# Altium footprint library RcTransmitterPcblib1.PcbLib: 17 footprints (part 1 of 2)
Each footprint in its own frame and in the unit in brackets; x right, y up, seen from the top. Pads: shape width x height; smd on the part's side, far side on the other; paste and mask are expansions set on the pad; w line width, h text height; cw(c..) or ccw(c..) is an arc to the next point about the centre after c.
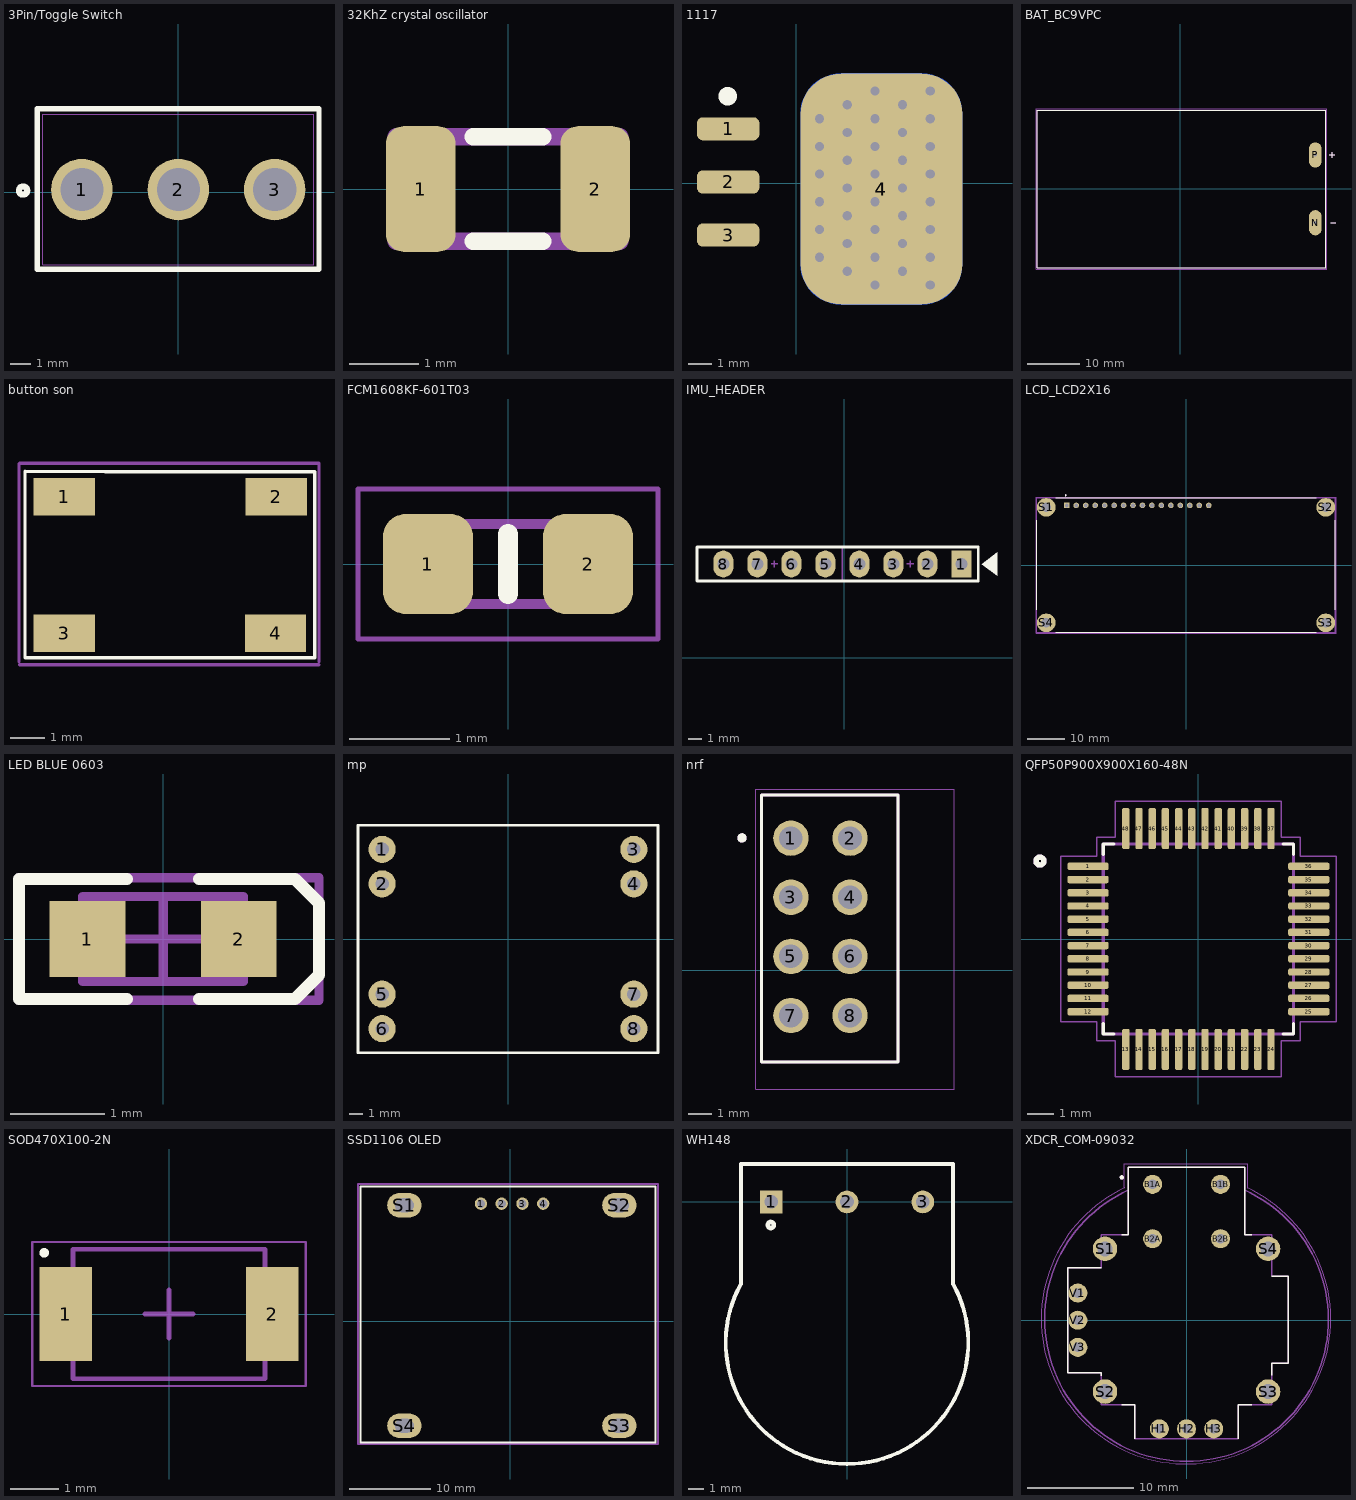
[diagram p0: the footprints below, top view; thin cyan lines are the x and y axes]

## 3Pin/Toggle Switch [mm] "4-1825136-5"
pads (3):
  round 3 hole 2.1: 1(-4.699,0.127) 2(0,0.127) 3(4.699,0.127)
Top Overlay:
  circle w0.3: c-7.569,0.076 r0.2
  lines w0.254: -6.883,-3.759 6.858,-3.759 6.858,4.064 -6.883,4.064 -6.883,-3.759
Mechanical 16:
  lines w0.05: -6.6,-3.552 6.6,-3.552 6.6,3.806 -6.6,3.806 -6.6,-3.552
3D body "c-4-1825136-5-a-3d.stp": height 29.3, standoff -5.24, extent -6.35,-3.302 6.35,3.556

## 32KhZ crystal oscillator [mm]
pads (2):
  rrect50% 1x1.8 smd: 1(-1.25,0) 2(1.25,0)
Top Overlay:
  lines w0.254: -0.5,-0.75 0.5,-0.75 ; -0.5,0.75 0.5,0.75
Mechanical 13:
  lines w0.254: -1.6,-0.75 1.6,-0.75 1.6,0.75 -1.6,0.75 -1.6,-0.75
3D body "User Library-NDK_NX3215SA.STEP": height 0.8, standoff 0, extent -1.6,-0.75 1.6,0.75

## 1117 [mm]
pads (5):
  rrect50% 2.7x1 smd paste-0.102 mask+0.051: 1(-2.95,2.351) 2(-2.95,0.051) 3(-2.95,-2.249)
  rrect50% 7x10 smd paste-0.102 mask+0.051: 4(3.683,-0.254)
  rrect50% 7x10 smd far side paste-0.102 mask+0.051: 4(3.683,-0.254)
via 5.798,-4.41 diameter 0.8 hole 0.4
via 3.398,-4.41 diameter 0.8 hole 0.4
via 5.798,-3.21 diameter 0.8 hole 0.4
via 4.598,-3.81 diameter 0.8 hole 0.4
via 3.398,-3.21 diameter 0.8 hole 0.4
via 2.198,-3.81 diameter 0.8 hole 0.4
via 0.998,-3.21 diameter 0.8 hole 0.4
via 5.798,-2.01 diameter 0.8 hole 0.4
via 4.598,-2.61 diameter 0.8 hole 0.4
via 3.398,-2.01 diameter 0.8 hole 0.4
via 2.198,-2.61 diameter 0.8 hole 0.4
via 0.998,-2.01 diameter 0.8 hole 0.4
via 5.798,-0.81 diameter 0.8 hole 0.4
via 4.598,-1.41 diameter 0.8 hole 0.4
via 3.398,-0.81 diameter 0.8 hole 0.4
via 2.198,-1.41 diameter 0.8 hole 0.4
via 0.998,-0.81 diameter 0.8 hole 0.4
via 5.798,0.39 diameter 0.8 hole 0.4
via 4.598,-0.21 diameter 0.8 hole 0.4
via 3.398,0.39 diameter 0.8 hole 0.4
via 2.198,-0.21 diameter 0.8 hole 0.4
via 0.998,0.39 diameter 0.8 hole 0.4
via 5.798,1.59 diameter 0.8 hole 0.4
via 4.598,0.99 diameter 0.8 hole 0.4
via 3.398,1.59 diameter 0.8 hole 0.4
via 2.198,0.99 diameter 0.8 hole 0.4
via 0.998,1.59 diameter 0.8 hole 0.4
via 5.798,2.79 diameter 0.8 hole 0.4
via 4.598,2.19 diameter 0.8 hole 0.4
via 3.398,2.79 diameter 0.8 hole 0.4
via 2.198,2.19 diameter 0.8 hole 0.4
via 0.998,2.79 diameter 0.8 hole 0.4
via 5.798,3.99 diameter 0.8 hole 0.4
via 4.598,3.39 diameter 0.8 hole 0.4
via 3.398,3.99 diameter 0.8 hole 0.4
via 2.198,3.39 diameter 0.8 hole 0.4
Top Overlay:
  circle w0.4: c-2.972,3.759 r0.2
3D body "SW3dPS-SOT-223-1.STEP": height 1.63, standoff -0.02, extent -3.754,-3.25 3.246,3.25

## BAT_BC9VPC [mil]
pads (2):
  oval 94.88x189.76 hole 26 square: N(1015,-255) P(1015,255)
Top Overlay:
  lines w5: 1121.55,254.99 1160.92,254.99 ; 1131.39,-256.82 1170.76,-256.82 ; 1141.24,235.31 1141.24,274.68 ; -1077,-594 -1077,592 1093,592 1093,-594 -1077,-594
Mechanical 13:
  lines w5: 1121.55,254.99 1160.92,254.99 ; 1131.39,-256.82 1170.76,-256.82 ; 1141.24,235.31 1141.24,274.68 ; -1077,-594 -1077,592 1093,592 1093,-594 -1077,-594
Mechanical 15:
  lines w1.97: -1086.84,-603.84 -1086.84,601.84 1102.84,601.84 1102.84,-603.84 -1086.84,-603.84
3D body "step_temp.STEP": height 845, standoff -191, extent -1085,-593 1085,593

## button son [mm]
pads (4):
  rect 1.8x1.1 smd mask+0.05: 1(9.25,9.35) 2(15.475,9.35) 3(9.25,5.35) 4(15.45,5.35)
Top Overlay:
  lines w0.1: 16.6,10.075 14.3,10.075 10.45,10.075 8.1,10.1 8.1,4.625 16.6,4.625 16.6,10.075 ; 16.6,10.075 16.6,10.075
Mechanical 3:
  lines w0.1: 7.925,4.5 7.925,10.3 7.95,10.325 10.144,10.325 11.241,10.325 13.434,10.325 14.531,10.325 16.725,10.325 16.725,4.5 ; 7.95,4.425 10.5,4.425 14.2,4.425 15.45,4.425 ; 15.425,4.425 15.825,4.425 16.725,4.425
3D body "User Library-4x4_SMD_Switch.step": height 1.5, standoff 0, extent 9.05,4.775 15.45,9.975

## FCM1608KF-601T03 [mm]
pads (2):
  rrect50% 0.9x1 smd: 1(-0.8,0) 2(0.8,0)
Top Overlay:
  lines w0.2: 0,-0.3 0,0.3
Mechanical 13:
  lines w0.1: -0.8,-0.4 0.8,-0.4 0.8,0.4 -0.8,0.4 -0.8,-0.4
Mechanical 15:
  lines w0.05: -1.5,-0.75 1.5,-0.75 1.5,0.75 -1.5,0.75 -1.5,-0.75
3D body "FCM1608KF-601T03.stp": height 0.95, standoff 0, extent -0.8,-0.4 0.8,0.4

## IMU_HEADER [mm]
pads (8):
  rect 1.5x2 hole 0.9: 1(8.75,7)
  oval 1.5x2 hole 0.9: 2(6.21,7) 3(3.67,7) 4(1.13,7) 5(-1.41,7) 6(-3.95,7) 7(-6.49,7) 8(-9.03,7)
Top Overlay:
  region: 11.417,6.107 11.417,7.885 10.274,6.996
  lines w0.2: -11,5.73 -11,8.27 10.02,8.27 10.02,5.73 -11,5.73
Mechanical 15:
  lines w0.1: -5.47,7 -4.97,7 ; -5.22,6.75 -5.22,7.25 ; 4.69,7 5.19,7 ; 4.94,6.75 4.94,7.25
  lines w0.127: -11,5.755 -11,8.245 10.02,8.245 10.02,5.755 -11,5.755
Mechanical 27:
  lines w0.127: -0.14,5.755 -0.14,8.245 10.02,8.245 10.02,5.755 -0.14,5.755
  text "'.Designator'" at 6.464,7.889 h3

## LCD_LCD2X16 [mm]
pads (20):
  rect 1.508x1.508 hole 1: 1(-32,16)
  round 1.508 hole 1: 2(-29.46,16) 3(-26.92,16) 4(-24.38,16) 5(-21.84,16) 6(-19.3,16) 7(-16.76,16) 8(-14.22,16) 9(-11.68,16) 10(-9.14,16) 11(-6.6,16) 12(-4.06,16) 13(-1.52,16) 14(1.02,16) 15(3.56,16) 16(6.1,16)
  round 5 hole 2.5: S1(-37.5,15.5) S2(37.5,15.5) S3(37.5,-15.5) S4(-37.5,-15.5)
Top Overlay:
  circle w0.2: c-32.3,18.7 r0.1
  lines w0.127: -40,-12 -40,12 ; -35,-18 35,-18 ; -35,18 35,18 ; 40,-12 40,12
Mechanical 13:
  circle w0.2: c-32.3,18.7 r0.1
  lines w0.127: -40,-18 -40,18 40,18 40,-18 -40,-18
Mechanical 15:
  lines w0.05: -40.25,-18.25 40.25,-18.25 40.25,18.25 -40.25,18.25 -40.25,-18.25
3D body "LCD2X16--3DModel-STEP-56544.STEP": height 7, standoff -3, extent -40,-18 40,18

## LED BLUE 0603 [mm]
pads (2):
  rect 0.8x0.8 smd: 1(-0.8,0) 2(0.8,0)
Top Overlay:
  lines w0.127: -0.381,-0.635 -1.524,-0.635 -1.524,0.635 -0.381,0.635 ; 0.381,-0.635 1.397,-0.635 1.651,-0.381 1.651,0.381 1.397,0.635 0.381,0.635
Mechanical 13:
  lines w0.1: -0.85,-0.45 0.85,-0.45 0.85,0.45 -0.85,0.45 -0.85,-0.45
Mechanical 15:
  lines w0.1: -0.45,0 0.45,0 ; 0,-0.45 0,0.45 ; -1.525,-0.65 1.651,-0.65 1.651,0.65 -1.525,0.65 -1.525,-0.65
3D body "User Library-LED_0603_B.STEP": height 0.59, standoff -0.01, extent -0.8,-0.4 0.8,0.4

## mp [mm]
pads (8):
  round 2 hole 1: 1(-9.271,6.604) 2(-9.271,4.064) 3(9.271,6.604) 4(9.271,4.064) 5(-9.271,-4.064) 6(-9.271,-6.604) 7(9.271,-4.064) 8(9.271,-6.604)
Top Overlay:
  lines w0.2: -11.049,-8.382 -11.049,8.382 11.049,8.382 11.049,-8.382 -11.049,-8.382
3D body "User Library-MP1584EN.STEP": height 8, standoff -4.64, extent -11.078,-8.491 10.922,8.509

## nrf [mil]
pads (8):
  round 60 hole 40: 1(-601.75,223.19) 2(-501.75,223.19) 3(-601.75,123.19) 4(-501.75,123.19) 5(-601.75,23.18) 6(-501.75,23.18) 7(-601.75,-76.81) 8(-501.75,-76.81)
Top Overlay:
  circle w7.87: c-684.45,223.62 r3.94
  lines w5: -651.73,296.5 -420.55,296.5 -420.55,-155.43 -651.69,-155.43 -651.69,296.46 -651.73,296.5
Mechanical 13:
  circle w7.87: c-684.45,223.62 r3.94
  lines w5: -651.75,-155.51 -651.75,296.5 -420.52,296.5 -420.28,296.26 -420.28,-155.51 -651.75,-155.51
Mechanical 15:
  lines w1.97: -325.32,-201.14 -661.59,-201.14 -661.59,306.34 -325.32,306.34 -325.32,-200.79
3D body "NRF24L01L.SLDPRT": height 688.98, standoff -59.06, extent -674.8,-231.1 1218.9,379.13

## QFP50P900X900X160-48N [mm]
pads (48):
  rrect50% 1.56x0.28 smd: 1(-4.18,2.75) 2(-4.18,2.25) 3(-4.18,1.75) 4(-4.18,1.25) 5(-4.18,0.75) 6(-4.18,0.25) 7(-4.18,-0.25) 8(-4.18,-0.75) 9(-4.18,-1.25) 10(-4.18,-1.75) 11(-4.18,-2.25) 12(-4.18,-2.75) 25(4.18,-2.75) 26(4.18,-2.25) 27(4.18,-1.75) 28(4.18,-1.25) 29(4.18,-0.75) 30(4.18,-0.25) 31(4.18,0.25) 32(4.18,0.75) 33(4.18,1.25) 34(4.18,1.75) 35(4.18,2.25) 36(4.18,2.75)
  rrect50% 0.28x1.56 smd: 13(-2.75,-4.18) 14(-2.25,-4.18) 15(-1.75,-4.18) 16(-1.25,-4.18) 17(-0.75,-4.18) 18(-0.25,-4.18) 19(0.25,-4.18) 20(0.75,-4.18) 21(1.25,-4.18) 22(1.75,-4.18) 23(2.25,-4.18) 24(2.75,-4.18) 37(2.75,4.18) 38(2.25,4.18) 39(1.75,4.18) 40(1.25,4.18) 41(0.75,4.18) 42(0.25,4.18) 43(-0.25,4.18) 44(-0.75,4.18) 45(-1.25,4.18) 46(-1.75,4.18) 47(-2.25,4.18) 48(-2.75,4.18)
Top Overlay:
  circle w0.2: c-6,2.95 r0.15
  lines w0.127: -3.6,-3.21 -3.6,-3.6 -3.21,-3.6 ; -3.6,3.21 -3.6,3.6 -3.21,3.6 ; 3.21,-3.6 3.6,-3.6 3.6,-3.21 ; 3.21,3.6 3.6,3.6 3.6,3.21
Mechanical 13:
  circle w0.2: c-6,2.95 r0.15
  lines w0.127: -3.6,-3.6 -3.6,3.6 3.6,3.6 3.6,-3.6 -3.6,-3.6
Mechanical 15:
  lines w0.05: -5.21,-3.14 -5.21,3.14 -3.85,3.14 -3.85,3.85 -3.14,3.85 -3.14,5.21 3.14,5.21 3.14,3.85 3.85,3.85 3.85,3.14 5.21,3.14 5.21,-3.14 3.85,-3.14 3.85,-3.85 3.14,-3.85 3.14,-5.21 -3.14,-5.21 -3.14,-3.85 -3.85,-3.85 -3.85,-3.14 -5.21,-3.14
3D body "STM32F103C8T6--3DModel-STEP-56544.STEP": height 1.58, standoff -0.02, extent -4.5,-4.5 4.5,4.5

## SOD470X100-2N [mm]
pads (2):
  rect 1.1x1.95 smd: 1(-2.15,0) 2(2.15,0)
Top Overlay:
  circle w0.1: c-2.6,1.275 r0.05
Mechanical 13:
  lines w0.1: -2,-1.35 2,-1.35 2,1.35 -2,1.35 -2,-1.35
Mechanical 15:
  lines w0.05: -2.85,-1.5 2.85,-1.5 2.85,1.5 -2.85,1.5 -2.85,-1.5
  lines w0.1: -0.5,0 0.5,0 ; 0,-0.5 0,0.5
3D body "SOD470X100-2N.step": height 1, standoff 0, extent -2.35,-1.35 2.35,1.35

## SSD1106 OLED [mm]
pads (8):
  round 1.508 hole 1: 1(-3.564,14.395) 2(-1.024,14.395) 3(1.516,14.395) 4(4.056,14.395)
  oval 4.2x3 hole 1.7 slot 2.3 at 0 deg: S1(-12.925,14.2) S2(13.375,14.2) S3(13.375,-12.775) S4(-12.925,-12.775)
Top Overlay:
  lines w0.254: -18.3,-14.8 -18.3,16.5 17.8,16.5 17.8,-14.8 -18.3,-14.8
Mechanical 15:
  lines w0.254: -18.6,-15 18.1,-15 18.1,16.8 -18.6,16.8 -18.6,-15
3D body "oled 1.3_stp.step": height 3.25, standoff 0.15, extent -18.25,-14.8 17.75,16.4

## WH148 [mm]
pads (3):
  rect 1.5x1.5 hole 0.9: 1(-4.999,0)
  round 1.5 hole 0.9: 2(0,0) 3(5,0)
Top Overlay:
  circle w0.3: c-5.025,-1.525 r0.2
  lines w0.254: -7,-5.4 -7,-4.9 ; -6.997,-5.407 ccw(c0,-9.285) 6.997,-5.407 ; 7,-5.4 7,2.5 -7,2.5 -7,-4.9 ; -7,-4.9 -7,-4.9
3D body "Potentiometer.step": height 20.7, standoff -3.8, extent -8,-18.1 8,5.9

## XDCR_COM-09032 [mil]
pads (14):
  round 70 hole 35.43: B1A(-125,500) B1B(125,500) B2A(-125,300) B2B(125,300)
  round 70 hole 35: H1(-100,-400) H2(0,-400) H3(100,-400) V1(-400,100) V2(-400,0) V3(-400,-100)
  round 90 hole 55: S1(-300,262.5) S2(-300,-262.5) S3(300,-262.5) S4(300,262.5)
Top Overlay:
  circle w7.87: c-238.19,525.59 r3.94
  lines w5: -312.99,-203.54 -312.99,-192.91 -437.01,-192.91 -437.01,192.91 -312.99,192.91 ; -238.98,-311.02 -190.94,-311.02 -190.94,-437.01 ; -238.98,314.96 -214.57,314.96 -214.57,562.99 214.57,562.99 214.57,314.96 239.37,314.96 ; 190.94,-437.01 190.94,-311.02 239.37,-311.02 ; 312.99,-201.57 312.99,-157.48 374.02,-157.48 374.02,161.42 312.99,161.42
Mechanical 13:
  circle w7.87: c-238.19,525.59 r3.94
  lines w5: -212.33,479.35 ccw(c0,2.45) 212.33,479.35 ; -437.01,-192.91 -312.99,-192.91 -312.99,-311.02 -190.94,-311.02 -190.94,-437.01 190.94,-437.01 190.94,-311.02 312.99,-311.02 312.99,-157.48 374.02,-157.48 374.02,161.42 312.99,161.42 312.99,314.96 214.57,314.96 214.57,562.99 -214.57,562.99 -214.57,314.96 -312.99,314.96 -312.99,192.91 -437.01,192.91 -437.01,-192.91
Mechanical 15:
  lines w1.97: -228.35,486.22 -228.35,574.8 224.41,574.8 224.41,486.22 ; -227.17,486.77 ccw(c-1.97,3.83) 223.23,486.77
3D body "COM-09032--3DModel-STEP-56544.STEP": height 1190, standoff -175, extent -525,-524.07 525,563.43